# Altium footprint library can.PcbLib: 70 footprints (part 2 of 5)
Each footprint in its own frame and in the unit in brackets; x right, y up, seen from the top. Pads: shape width x height; smd on the part's side, far side on the other; paste and mask are expansions set on the pad; w line width, h text height; cw(c..) or ccw(c..) is an arc to the next point about the centre after c.
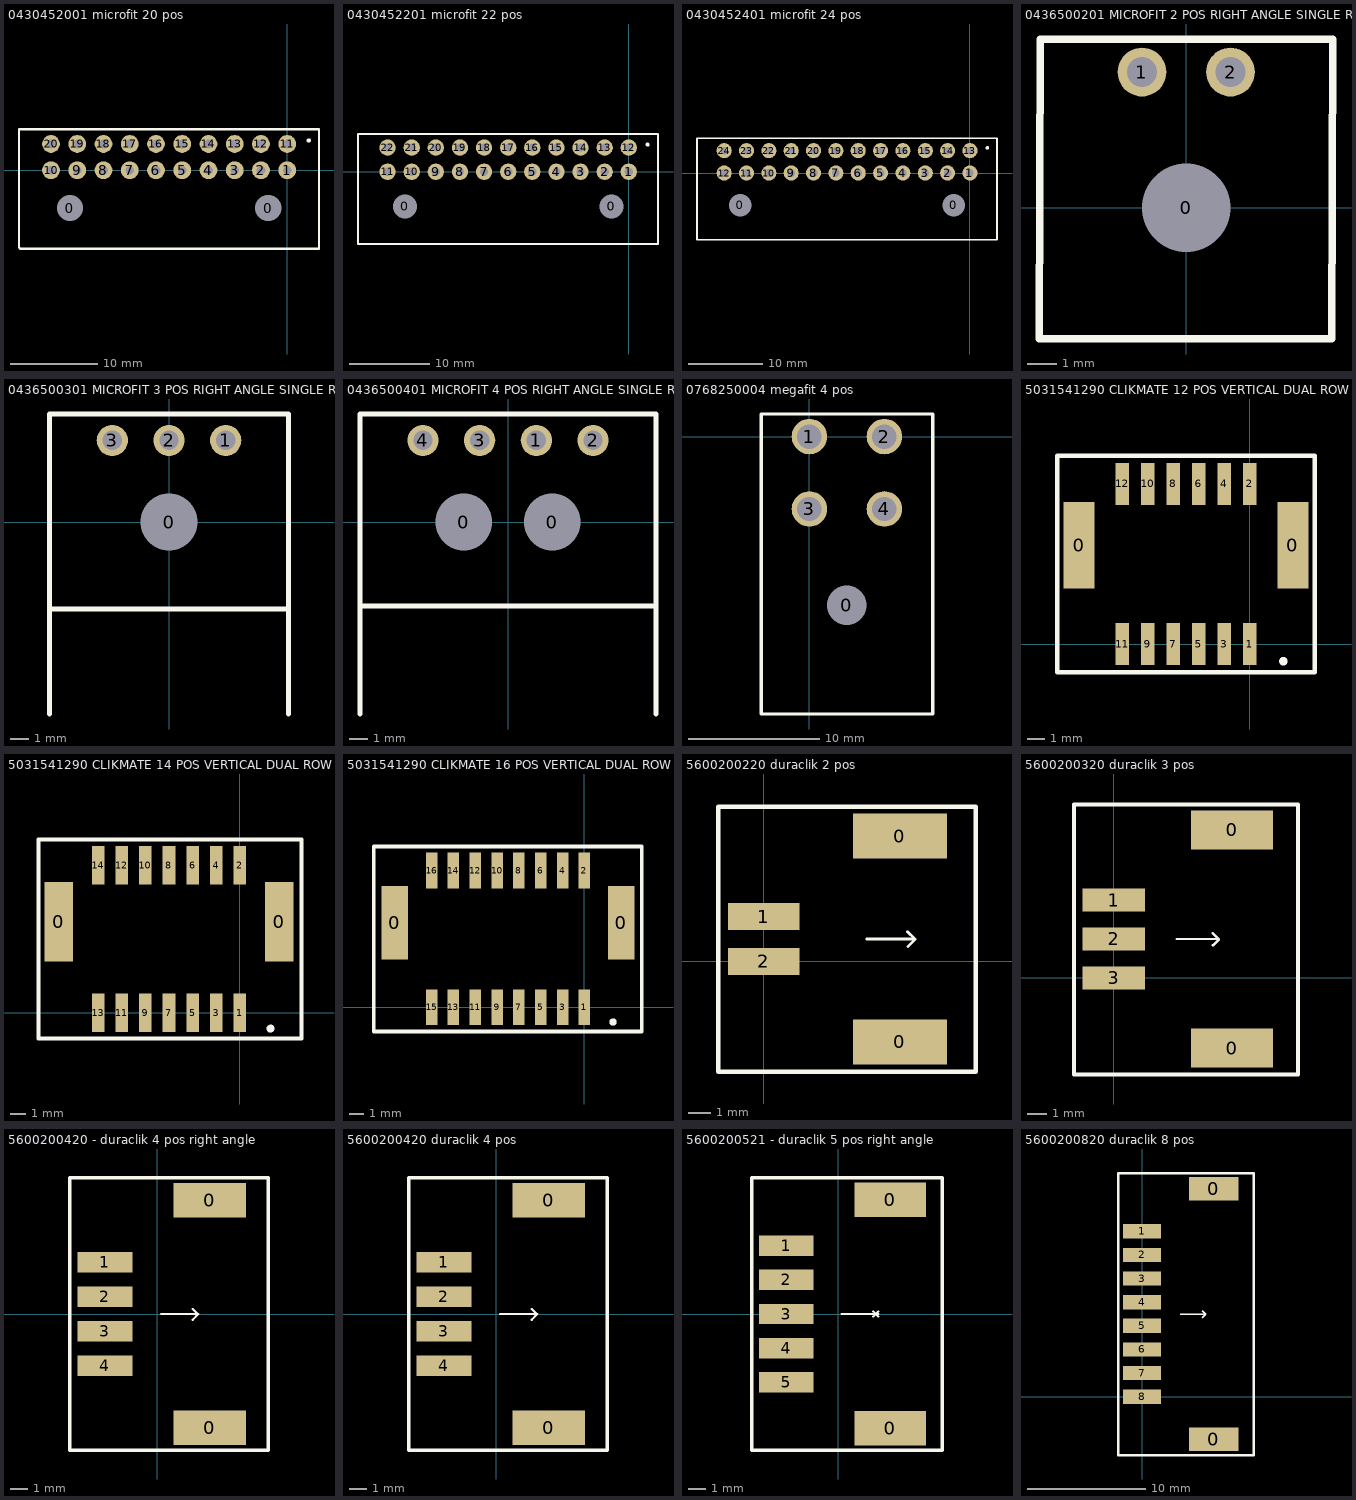
[diagram p1: the footprints below, top view; thin cyan lines are the x and y axes]

## 0430452001 microfit 20 pos [mil] "microfit 20 pos plastic board lock pegs"
pads (22):
  round 80 hole 118.11 unplated: 0(-977.95,-170.08) 0(-85.04,-170.08)
  round 80 hole 40: 1(0,0) 2(-118.11,0) 3(-236.22,0) 4(-354.33,0) 5(-472.44,0) 6(-590.55,0) 7(-708.66,0) 8(-826.77,0) 9(-944.88,0) 10(-1062.99,0) 11(0,118.11) 12(-118.11,118.11) 13(-236.22,118.11) 14(-354.33,118.11) 15(-472.44,118.11) 16(-590.55,118.11) 17(-708.66,118.11) 18(-826.77,118.11) 19(-944.88,118.11) 20(-1062.99,118.11)
Top Overlay:
  circle w9.84: c97,134 r4.92
  lines w10: -1207,-348 -1202,-353 142,-353 143,-352 143,184 -1207,184 -1207,-348
3D body "430452001 20 pos.stp": height 347.64, standoff -122.83, extent -1204.23,-348.07 140.25,133.81

## 0430452201 microfit 22 pos [mil] "microfit 22 pos plastic board lock pegs"
pads (24):
  round 80 hole 118.11 unplated: 0(-1096.06,-170.08) 0(-85.04,-170.08)
  round 80 hole 40: 1(0,0) 2(-118.11,0) 3(-236.22,0) 4(-354.33,0) 5(-472.44,0) 6(-590.55,0) 7(-708.66,0) 8(-826.77,0) 9(-944.88,0) 10(-1062.99,0) 11(-1181.1,0) 12(0,118.11) 13(-118.11,118.11) 14(-236.22,118.11) 15(-354.33,118.11) 16(-472.44,118.11) 17(-590.55,118.11) 18(-708.66,118.11) 19(-826.77,118.11) 20(-944.88,118.11) 21(-1062.99,118.11) 22(-1181.1,118.11)
Top Overlay:
  circle w9.84: c92,133 r4.92
  lines w10: -1326,-353 -1326,184 143,184 143,-352 142,-353 -1326,-353
3D body "430452201 22 pos.stp": height 347.64, standoff -122.83, extent -1321.85,-348.07 140.75,133.81

## 0430452401 microfit 24 pos [mil] "microfit 24 pos plastic board lock pegs"
pads (26):
  round 80 hole 118.11 unplated: 0(-1214.17,-170.08) 0(-85.04,-170.08)
  round 80 hole 40: 1(0,0) 2(-118.11,0) 3(-236.22,0) 4(-354.33,0) 5(-472.44,0) 6(-590.55,0) 7(-708.66,0) 8(-826.77,0) 9(-944.88,0) 10(-1062.99,0) 11(-1181.1,0) 12(-1299.21,0) 13(0,118.11) 14(-118.11,118.11) 15(-236.22,118.11) 16(-354.33,118.11) 17(-472.44,118.11) 18(-590.55,118.11) 19(-708.66,118.11) 20(-826.77,118.11) 21(-944.88,118.11) 22(-1062.99,118.11) 23(-1181.1,118.11) 24(-1299.21,118.11)
Top Overlay:
  circle w9.84: c92,133 r4.92
  lines w10: -1443,-353 142,-353 143,-352 143,184 -1443,184 -1443,-353
3D body "430452401 24 pos.stp": height 347.64, standoff -122.83, extent -1439.96,-348.07 140.75,133.81

## 0436500201 MICROFIT 2 POS RIGHT ANGLE SINGLE ROW [mil]
pads (3):
  round 100 hole 117.99 unplated: 0(0,0)
  round 65 hole 40: 1(-59.06,180.89) 2(59.06,180.89)
Top Overlay:
  lines w10: -195.88,-175 -194.8,225 195.16,225 194.07,-175 -195.88,-175
3D body "436500201.stp": height 241.54, standoff -109.05, extent -189.96,-170.88 189.96,218.89

## 0436500301 MICROFIT 3 POS RIGHT ANGLE SINGLE ROW [mm]
pads (4):
  round 2.54 hole 2.997 unplated: 0(0,0)
  round 1.651 hole 1.02: 1(3,4.32) 2(0,4.32) 3(-3,4.32)
Top Overlay:
  lines w0.254: -6.325,-10.16 -6.325,5.715 6.325,5.715 6.325,-10.16 ; -6.325,-4.6 6.325,-4.6
3D body "436500301.stp": height 6.13, standoff -2.77, extent -6.325,-4.34 6.325,5.56

## 0436500401 MICROFIT 4 POS RIGHT ANGLE SINGLE ROW [mm]
pads (6):
  round 2.54 hole 2.997 unplated: 0(-2.35,0) 0(2.35,0)
  round 1.651 hole 1.02: 1(1.5,4.32) 2(4.5,4.32) 3(-1.5,4.32) 4(-4.5,4.32)
Top Overlay:
  lines w0.254: -7.825,-10.16 -7.825,5.715 7.825,5.715 7.825,-10.16 ; -7.825,-4.445 7.825,-4.445
3D body "436500401.stp": height 6.13, standoff -2.77, extent -7.825,-4.34 7.825,5.56

## 0768250004 megafit 4 pos [mm] "molex megafit 4 pos"
pads (5):
  round 2.7 hole 3 unplated: 0(2.85,-12.8)
  round 2.7 hole 1.85: 1(0,0) 2(5.7,0) 3(0,-5.5) 4(5.7,-5.5)
Top Overlay:
  lines w0.254: -3.66,-21.082 -3.66,1.718 9.375,1.718 9.375,-21.082 -3.66,-21.082
3D body "768250004 megafit.stp": height 14.62, standoff -3.52, extent -3.18,-21.395 8.88,0.567

## 5031541290 CLIKMATE 12 POS VERTICAL DUAL ROW [mm]
pads (14):
  rect 1.8x5.05 smd: 0(-10.03,5.8) 0(2.53,5.8)
  rect 0.8x2.45 smd: 1(0,0) 2(0,9.4) 3(-1.5,0) 4(-1.5,9.4) 5(-3,0) 6(-3,9.4) 7(-4.5,0) 8(-4.5,9.4) 9(-6,0) 10(-6,9.4) 11(-7.5,0) 12(-7.5,9.4)
Top Overlay:
  circle w0.25: c1.967,-1.008 r0.125
  lines w0.254: -11.303,-1.651 -11.303,11.049 3.81,11.049 3.81,-1.651 -11.303,-1.651
3D body "5031541290.stp": height 8.78, standoff -0.04, extent -10.333,-0.726 2.967,10.124

## 5031541290 CLIKMATE 14 POS VERTICAL DUAL ROW [mm]
pads (16):
  rect 1.8x5.05 smd: 0(-11.53,5.8) 0(2.53,5.8)
  rect 0.8x2.45 smd: 1(0,0) 2(0,9.4) 3(-1.5,0) 4(-1.5,9.4) 5(-3,0) 6(-3,9.4) 7(-4.5,0) 8(-4.5,9.4) 9(-6,0) 10(-6,9.4) 11(-7.5,0) 12(-7.5,9.4) 13(-9,0) 14(-9,9.4)
Top Overlay:
  circle w0.25: c1.967,-1.008 r0.125
  lines w0.254: -12.827,-1.651 3.937,-1.651 3.937,11.049 -12.827,11.049 -12.827,-1.651
3D body "5031541490.stp": height 8.78, standoff -0.04, extent -11.845,-0.726 2.955,10.124

## 5031541290 CLIKMATE 16 POS VERTICAL DUAL ROW [mm]
pads (18):
  rect 1.8x5.05 smd: 0(-13.03,5.8) 0(2.53,5.8)
  rect 0.8x2.45 smd: 1(0,0) 2(0,9.4) 3(-1.5,0) 4(-1.5,9.4) 5(-3,0) 6(-3,9.4) 7(-4.5,0) 8(-4.5,9.4) 9(-6,0) 10(-6,9.4) 11(-7.5,0) 12(-7.5,9.4) 13(-9,0) 14(-9,9.4) 15(-10.5,0) 16(-10.5,9.4)
Top Overlay:
  circle w0.25: c1.967,-1.008 r0.125
  lines w0.254: -14.478,-1.651 3.937,-1.651 3.937,11.049 -14.478,11.049 -14.478,-1.651
3D body "5031541690.stp": height 8.78, standoff -0.04, extent -13.345,-0.726 2.955,10.124

## 5600200220 duraclik 2 pos [mm] "molex duraclik 2 pos"
pads (4):
  rect 4.2x2 smd: 0(6.08,-3.6) 0(6.08,5.6)
  rect 3.2x1.2 smd: 1(0,2) 2(0,0)
Top Overlay:
  lines w0.127: 4.593,0.996 6.746,0.996 6.421,1.321 ; 6.437,0.667 6.746,0.976
  lines w0.2: -2.032,-4.939 9.46,-4.939 9.46,6.91 -2.032,6.91 -2.032,-4.939
3D body "5600200220.stp": height 8, standoff 0, extent -0.369,-4.476 8.78,6.424

## 5600200320 duraclik 3 pos [mm] "molex duraclik 3 pos"
pads (5):
  rect 4.2x2 smd: 0(6.08,-3.6) 0(6.08,7.6)
  rect 3.2x1.2 smd: 1(0,4) 2(0,2) 3(0,0)
Top Overlay:
  lines w0.127: 3.246,2 5.405,2 ; 5.09,1.671 5.399,1.98 5.09,2.289
  lines w0.2: -2.032,-4.953 -2.032,8.91 9.46,8.91 9.46,-4.953 -2.032,-4.953
3D body "5600200320.stp": height 8, standoff 0, extent 0.005,-4.28 9.155,8.32

## 5600200420 - duraclik 4 pos right angle [mm] "molex duraclik 4 pos horizontal entry"
pads (6):
  rect 4.2x2 smd: 0(3.04,-6.6) 0(3.04,6.6)
  rect 3.2x1.2 smd: 1(-3.04,3) 2(-3.04,1) 3(-3.04,-1) 4(-3.04,-3)
Top Overlay:
  lines w0.127: 0.206,0 2.365,0 ; 2.05,-0.329 2.359,-0.02 2.05,0.289
  lines w0.2: -5.072,-7.91 -5.072,7.91 6.42,7.91 6.42,-7.91 -5.072,-7.91
3D body "5023520400.stp": height 6.36, standoff -0.04, extent -3.616,-5.919 5.784,6.081

## 5600200420 duraclik 4 pos [mm] "molex duraclik 4 pos vertical"
pads (6):
  rect 4.2x2 smd: 0(3.04,-6.6) 0(3.04,6.6)
  rect 3.2x1.2 smd: 1(-3.04,3) 2(-3.04,1) 3(-3.04,-1) 4(-3.04,-3)
Top Overlay:
  lines w0.127: 0.206,0 2.365,0 ; 2.05,-0.329 2.359,-0.02 2.05,0.289
  lines w0.2: -5.072,-7.91 -5.072,7.91 6.42,7.91 6.42,-7.91 -5.072,-7.91
3D body "5600200420.stp": height 8, standoff 0, extent -3.035,-7.28 6.115,7.32

## 5600200521 - duraclik 5 pos right angle [mm] "molex duraclik 5 pos horizontal entry"
pads (7):
  rect 4.2x2 smd: 0(3.04,-6.7) 0(3.04,6.7)
  rect 3.2x1.2 smd: 1(-3.04,4) 2(-3.04,2) 3(-3.04,0) 4(-3.04,-2) 5(-3.04,-4)
Top Overlay:
  lines w0.127: 0.206,0 2.365,0 ; 2.05,-0.154 2.359,0.154 ; 2.05,0.154 2.359,-0.154
  lines w0.2: -5.072,-8.001 6.096,-8.001 6.096,8.001 -5.072,8.001 -5.072,-8.001
3D body "5023520500.stp": height 6.36, standoff -0.04, extent -3.684,-7.112 5.716,6.888

## 5600200820 duraclik 8 pos [mm] "duraclik 8 pos vertical header"
pads (10):
  rect 4.2x2 smd: 0(6.08,-3.6) 0(6.08,17.6)
  rect 3.2x1.2 smd: 1(0,14) 2(0,12) 3(0,10) 4(0,8) 5(0,6) 6(0,4) 7(0,2) 8(0,0)
Top Overlay:
  lines w0.127: 3.246,7 5.405,7 ; 5.09,6.671 5.399,6.98 5.09,7.289
  lines w0.2: -2.032,-4.97 -2.032,18.91 9.46,18.91 9.46,-4.97 -2.032,-4.97
3D body "5600200820.stp": height 8, standoff 0, extent 0.005,-4.28 9.155,18.32